# Altium footprint library SAMTEC THD.PcbLib: 161 footprints (part 11 of 12) (continued)
## SAMTEC_TSW-115-23-L-D [mm] "30 Contacts - Pitch 2.54mm - Dual Row  Through Mount Straigh Header (Post Lead 5.84mm, Tail Lead 2.92mm, Insulator 2.54mm)"
height 8.38
pads (30):
  round 1.7 hole 1: 1(-17.78,-1.27) 2(-17.78,1.27) 3(-15.24,-1.27) 4(-15.24,1.27) 5(-12.7,-1.27) 6(-12.7,1.27) 7(-10.16,-1.27) 8(-10.16,1.27) 9(-7.62,-1.27) 10(-7.62,1.27) 11(-5.08,-1.27) 12(-5.08,1.27) 13(-2.54,-1.27) 14(-2.54,1.27) 15(0,-1.27) 16(0,1.27) 17(2.54,-1.27) 18(2.54,1.27) 19(5.08,-1.27) 20(5.08,1.27) 21(7.62,-1.27) 22(7.62,1.27) 23(10.16,-1.27) 24(10.16,1.27) 25(12.7,-1.27) 26(12.7,1.27) 27(15.24,-1.27) 28(15.24,1.27) 29(17.78,-1.27) 30(17.78,1.27)
Top Overlay:
  circle w0.3: c-17.745,-3.135 r0.15
  lines w0.2: -19.05,-2.54 -16.764,-2.54 -16.764,-2.286 -16.256,-2.286 -16.256,-2.54 -14.224,-2.54 -14.224,-2.286 -13.716,-2.286 -13.716,-2.54 -11.684,-2.54 -11.684,-2.286 -11.176,-2.286 -11.176,-2.54 -9.144,-2.54 -9.144,-2.286 -8.636,-2.286 -8.636,-2.54 -6.604,-2.54 -6.604,-2.286 -6.096,-2.286 -6.096,-2.54 -4.064,-2.54 -4.064,-2.286 -3.556,-2.286 -3.556,-2.54 -1.524,-2.54 -1.524,-2.286 -1.016,-2.286 -1.016,-2.54 1.016,-2.54 1.016,-2.286 1.524,-2.286 1.524,-2.54 3.556,-2.54 3.556,-2.286 4.064,-2.286 4.064,-2.54 6.096,-2.54 6.096,-2.286 6.604,-2.286 6.604,-2.54 8.636,-2.54 8.636,-2.286 9.144,-2.286 9.144,-2.54 11.176,-2.54 11.176,-2.286 11.684,-2.286 11.684,-2.54 13.716,-2.54 13.716,-2.286 14.224,-2.286 14.224,-2.54 16.256,-2.54 16.256,-2.286 16.764,-2.286 16.764,-2.54 19.05,-2.54 19.05,2.54 16.764,2.54 16.764,2.286 16.256,2.286 16.256,2.54 14.224,2.54 14.224,2.286 13.716,2.286 13.716,2.54 11.684,2.54 11.684,2.286 11.176,2.286 11.176,2.54 9.144,2.54 9.144,2.286 8.636,2.286 8.636,2.54 6.604,2.54 6.604,2.286 6.096,2.286 6.096,2.54 4.064,2.54 4.064,2.286 3.556,2.286 3.556,2.54 1.524,2.54 1.524,2.286 1.016,2.286 1.016,2.54 -1.016,2.54 -1.016,2.286 -1.524,2.286 -1.524,2.54 -3.556,2.54 -3.556,2.286 -4.064,2.286 -4.064,2.54 -6.096,2.54 -6.096,2.286 -6.604,2.286 -6.604,2.54 -8.636,2.54 -8.636,2.286 -9.144,2.286 -9.144,2.54 -11.176,2.54 -11.176,2.286 -11.684,2.286 -11.684,2.54 -13.716,2.54 -13.716,2.286 -14.224,2.286 -14.224,2.54 -16.256,2.54 -16.256,2.286 -16.764,2.286 -16.764,2.54 -19.05,2.54 -19.05,-2.54
  text "1" at -20.152,-1.768 h1.2
Mechanical 8:
  lines w0.05: -18.28,-1.27 -17.78,-1.27 ; -18.28,1.27 -17.78,1.27 ; -17.78,-1.77 -17.78,-1.27 ; -17.78,-0.77 -17.78,-1.27 ; -17.78,0.77 -17.78,1.27 ; -17.78,1.77 -17.78,1.27 ; -17.28,-1.27 -17.78,-1.27 ; -17.28,1.27 -17.78,1.27 ; -15.74,-1.27 -15.24,-1.27 ; -15.74,1.27 -15.24,1.27 ; -15.24,-1.77 -15.24,-1.27 ; -15.24,-0.77 -15.24,-1.27 ; -15.24,0.77 -15.24,1.27 ; -15.24,1.77 -15.24,1.27 ; -14.74,-1.27 -15.24,-1.27 ; -14.74,1.27 -15.24,1.27 ; -13.2,-1.27 -12.7,-1.27 ; -13.2,1.27 -12.7,1.27 ; -12.7,-1.77 -12.7,-1.27 ; -12.7,-0.77 -12.7,-1.27 ; -12.7,0.77 -12.7,1.27 ; -12.7,1.77 -12.7,1.27 ; -12.2,-1.27 -12.7,-1.27 ; -12.2,1.27 -12.7,1.27 ; -10.66,-1.27 -10.16,-1.27 ; -10.66,1.27 -10.16,1.27 ; -10.16,-1.77 -10.16,-1.27 ; -10.16,-0.77 -10.16,-1.27 ; -10.16,0.77 -10.16,1.27 ; -10.16,1.77 -10.16,1.27 ; -9.66,-1.27 -10.16,-1.27 ; -9.66,1.27 -10.16,1.27 ; -8.12,-1.27 -7.62,-1.27 ; -8.12,1.27 -7.62,1.27 ; -7.62,-1.77 -7.62,-1.27 ; -7.62,-0.77 -7.62,-1.27 ; -7.62,0.77 -7.62,1.27 ; -7.62,1.77 -7.62,1.27 ; -7.12,-1.27 -7.62,-1.27 ; -7.12,1.27 -7.62,1.27 ; -5.58,-1.27 -5.08,-1.27 ; -5.58,1.27 -5.08,1.27 ; -5.08,-1.77 -5.08,-1.27 ; -5.08,-0.77 -5.08,-1.27 ; -5.08,0.77 -5.08,1.27 ; -5.08,1.77 -5.08,1.27 ; -4.58,-1.27 -5.08,-1.27 ; -4.58,1.27 -5.08,1.27 ; -3.04,-1.27 -2.54,-1.27 ; -3.04,1.27 -2.54,1.27 ; -2.54,-1.77 -2.54,-1.27 ; -2.54,-0.77 -2.54,-1.27 ; -2.54,0.77 -2.54,1.27 ; -2.54,1.77 -2.54,1.27 ; -2.04,-1.27 -2.54,-1.27 ; -2.04,1.27 -2.54,1.27 ; -0.5,-1.27 0,-1.27 ; -0.5,0 0,0 ; -0.5,1.27 0,1.27 ; 0,-1.77 0,-1.27 ; 0,-0.77 0,-1.27 ; 0,-0.5 0,0 ; 0,0.5 0,0 ; 0,0.77 0,1.27 ; 0,1.77 0,1.27 ; 0.5,-1.27 0,-1.27 ; 0.5,0 0,0 ; 0.5,1.27 0,1.27 ; 2.04,-1.27 2.54,-1.27 ; 2.04,1.27 2.54,1.27 ; 2.54,-1.77 2.54,-1.27 ; 2.54,-0.77 2.54,-1.27 ; 2.54,0.77 2.54,1.27 ; 2.54,1.77 2.54,1.27 ; 3.04,-1.27 2.54,-1.27 ; 3.04,1.27 2.54,1.27 ; 4.58,-1.27 5.08,-1.27 ; 4.58,1.27 5.08,1.27 ; 5.08,-1.77 5.08,-1.27 ; 5.08,-0.77 5.08,-1.27 ; 5.08,0.77 5.08,1.27 ; 5.08,1.77 5.08,1.27 ; 5.58,-1.27 5.08,-1.27 ; 5.58,1.27 5.08,1.27 ; 7.12,-1.27 7.62,-1.27 ; 7.12,1.27 7.62,1.27 ; 7.62,-1.77 7.62,-1.27 ; 7.62,-0.77 7.62,-1.27 ; 7.62,0.77 7.62,1.27 ; 7.62,1.77 7.62,1.27 ; 8.12,-1.27 7.62,-1.27 ; 8.12,1.27 7.62,1.27 ; 9.66,-1.27 10.16,-1.27 ; 9.66,1.27 10.16,1.27 ; 10.16,-1.77 10.16,-1.27 ; 10.16,-0.77 10.16,-1.27 ; 10.16,0.77 10.16,1.27 ; 10.16,1.77 10.16,1.27 ; 10.66,-1.27 10.16,-1.27 ; 10.66,1.27 10.16,1.27 ; 12.2,-1.27 12.7,-1.27 ; 12.2,1.27 12.7,1.27 ; 12.7,-1.77 12.7,-1.27 ; 12.7,-0.77 12.7,-1.27 ; 12.7,0.77 12.7,1.27 ; 12.7,1.77 12.7,1.27 ; 13.2,-1.27 12.7,-1.27 ; 13.2,1.27 12.7,1.27 ; 14.74,-1.27 15.24,-1.27 ; 14.74,1.27 15.24,1.27 ; 15.24,-1.77 15.24,-1.27 ; 15.24,-0.77 15.24,-1.27 ; 15.24,0.77 15.24,1.27 ; 15.24,1.77 15.24,1.27 ; 15.74,-1.27 15.24,-1.27 ; 15.74,1.27 15.24,1.27 ; 17.28,-1.27 17.78,-1.27 ; 17.28,1.27 17.78,1.27 ; 17.78,-1.77 17.78,-1.27 ; 17.78,-0.77 17.78,-1.27 ; 17.78,0.77 17.78,1.27 ; 17.78,1.77 17.78,1.27 ; 18.28,-1.27 17.78,-1.27 ; 18.28,1.27 17.78,1.27
Mechanical 14:
  lines w0.1: -16.764,-2.286 -16.256,-2.286 ; -16.764,-0.508 -16.256,-0.508 ; -16.764,0.508 -16.256,0.508 ; -16.764,2.286 -16.256,2.286 ; -14.224,-2.286 -13.716,-2.286 ; -14.224,-0.508 -13.716,-0.508 ; -14.224,0.508 -13.716,0.508 ; -14.224,2.286 -13.716,2.286 ; -11.684,-2.286 -11.176,-2.286 ; -11.684,-0.508 -11.176,-0.508 ; -11.684,0.508 -11.176,0.508 ; -11.684,2.286 -11.176,2.286 ; -9.144,-2.286 -8.636,-2.286 ; -9.144,-0.508 -8.636,-0.508 ; -9.144,0.508 -8.636,0.508 ; -9.144,2.286 -8.636,2.286 ; -6.604,-2.286 -6.096,-2.286 ; -6.604,-0.508 -6.096,-0.508 ; -6.604,0.508 -6.096,0.508 ; -6.604,2.286 -6.096,2.286 ; -4.064,-2.286 -3.556,-2.286 ; -4.064,-0.508 -3.556,-0.508 ; -4.064,0.508 -3.556,0.508 ; -4.064,2.286 -3.556,2.286 ; -1.524,-2.286 -1.016,-2.286 ; -1.524,-0.508 -1.016,-0.508 ; -1.524,0.508 -1.016,0.508 ; -1.524,2.286 -1.016,2.286 ; 1.016,-2.286 1.524,-2.286 ; 1.016,-0.508 1.524,-0.508 ; 1.016,0.508 1.524,0.508 ; 1.016,2.286 1.524,2.286 ; 3.556,-2.286 4.064,-2.286 ; 3.556,-0.508 4.064,-0.508 ; 3.556,0.508 4.064,0.508 ; 3.556,2.286 4.064,2.286 ; 6.096,-2.286 6.604,-2.286 ; 6.096,-0.508 6.604,-0.508 ; 6.096,0.508 6.604,0.508 ; 6.096,2.286 6.604,2.286 ; 8.636,-2.286 9.144,-2.286 ; 8.636,-0.508 9.144,-0.508 ; 8.636,0.508 9.144,0.508 ; 8.636,2.286 9.144,2.286 ; 11.176,-2.286 11.684,-2.286 ; 11.176,-0.508 11.684,-0.508 ; 11.176,0.508 11.684,0.508 ; 11.176,2.286 11.684,2.286 ; 13.716,-2.286 14.224,-2.286 ; 13.716,-0.508 14.224,-0.508 ; 13.716,0.508 14.224,0.508 ; 13.716,2.286 14.224,2.286 ; 16.256,-2.286 16.764,-2.286 ; 16.256,-0.508 16.764,-0.508 ; 16.256,0.508 16.764,0.508 ; 16.256,2.286 16.764,2.286 ; -19.05,-2.54 -19.05,2.54 -16.764,2.54 -16.764,-2.54 -19.05,-2.54 ; -16.256,-2.54 -16.256,2.54 -14.224,2.54 -14.224,-2.54 -16.256,-2.54 ; -13.716,-2.54 -11.684,-2.54 -11.684,2.54 -13.716,2.54 -13.716,-2.54 ; -11.176,-2.54 -11.176,2.54 -9.144,2.54 -9.144,-2.54 -11.176,-2.54 ; -8.636,-2.54 -8.636,2.54 -6.604,2.54 -6.604,-2.54 -8.636,-2.54 ; -6.096,-2.54 -6.096,2.54 -4.064,2.54 -4.064,-2.54 -6.096,-2.54 ; -3.556,-2.54 -3.556,2.54 -1.524,2.54 -1.524,-2.54 -3.556,-2.54 ; -1.016,-2.54 -1.016,2.54 1.016,2.54 1.016,-2.54 -1.016,-2.54 ; 1.524,-2.54 1.524,2.54 3.556,2.54 3.556,-2.54 1.524,-2.54 ; 4.064,-2.54 4.064,2.54 6.096,2.54 6.096,-2.54 4.064,-2.54 ; 6.604,-2.54 6.604,2.54 8.636,2.54 8.636,-2.54 6.604,-2.54 ; 9.144,-2.54 9.144,2.54 11.176,2.54 11.176,-2.54 9.144,-2.54 ; 11.684,-2.54 11.684,2.54 13.716,2.54 13.716,-2.54 11.684,-2.54 ; 14.224,-2.54 14.224,2.54 16.256,2.54 16.256,-2.54 14.224,-2.54 ; 16.764,-2.54 16.764,2.54 19.05,2.54 19.05,-2.54 16.764,-2.54
3D body "SAMTEC_TSW-115-23-L-D.stp": height 8.38, standoff -2.92, extent -19.05,-2.54 19.05,2.54

## SAMTEC_TSW-116-08-L-D [mm] "32 Contacts - Pitch 2.54mm - Dual Row  Through Mount Straigh Header (Post Lead 5.84mm, Tail Lead 5.08mm, Insulator 2.54mm)"
height 8.38
pads (32):
  round 1.7 hole 1: 1(-19.05,-1.27) 2(-19.05,1.27) 3(-16.51,-1.27) 4(-16.51,1.27) 5(-13.97,-1.27) 6(-13.97,1.27) 7(-11.43,-1.27) 8(-11.43,1.27) 9(-8.89,-1.27) 10(-8.89,1.27) 11(-6.35,-1.27) 12(-6.35,1.27) 13(-3.81,-1.27) 14(-3.81,1.27) 15(-1.27,-1.27) 16(-1.27,1.27) 17(1.27,-1.27) 18(1.27,1.27) 19(3.81,-1.27) 20(3.81,1.27) 21(6.35,-1.27) 22(6.35,1.27) 23(8.89,-1.27) 24(8.89,1.27) 25(11.43,-1.27) 26(11.43,1.27) 27(13.97,-1.27) 28(13.97,1.27) 29(16.51,-1.27) 30(16.51,1.27) 31(19.05,-1.27) 32(19.05,1.27)
Top Overlay:
  circle w0.3: c-19.015,-3.135 r0.15
  lines w0.2: -20.32,-2.54 -20.32,2.54 -18.034,2.54 -18.034,2.286 -17.526,2.286 -17.526,2.54 -15.494,2.54 -15.494,2.286 -14.986,2.286 -14.986,2.54 -12.954,2.54 -12.954,2.286 -12.446,2.286 -12.446,2.54 -10.414,2.54 -10.414,2.286 -9.906,2.286 -9.906,2.54 -7.874,2.54 -7.874,2.286 -7.366,2.286 -7.366,2.54 -5.334,2.54 -5.334,2.286 -4.826,2.286 -4.826,2.54 -2.794,2.54 -2.794,2.286 -2.286,2.286 -2.286,2.54 -0.254,2.54 -0.254,2.286 0.254,2.286 0.254,2.54 2.286,2.54 2.286,2.286 2.794,2.286 2.794,2.54 4.826,2.54 4.826,2.286 5.334,2.286 5.334,2.54 7.366,2.54 7.366,2.286 7.874,2.286 7.874,2.54 9.906,2.54 9.906,2.286 10.414,2.286 10.414,2.54 12.446,2.54 12.446,2.286 12.954,2.286 12.954,2.54 14.986,2.54 14.986,2.286 15.494,2.286 15.494,2.54 17.526,2.54 17.526,2.286 18.034,2.286 18.034,2.54 20.32,2.54 20.32,-2.54 18.034,-2.54 18.034,-2.286 17.526,-2.286 17.526,-2.54 15.494,-2.54 15.494,-2.286 14.986,-2.286 14.986,-2.54 12.954,-2.54 12.954,-2.286 12.446,-2.286 12.446,-2.54 10.414,-2.54 10.414,-2.286 9.906,-2.286 9.906,-2.54 7.874,-2.54 7.874,-2.286 7.366,-2.286 7.366,-2.54 5.334,-2.54 5.334,-2.286 4.826,-2.286 4.826,-2.54 2.794,-2.54 2.794,-2.286 2.286,-2.286 2.286,-2.54 0.254,-2.54 0.254,-2.286 -0.254,-2.286 -0.254,-2.54 -2.286,-2.54 -2.286,-2.286 -2.794,-2.286 -2.794,-2.54 -4.826,-2.54 -4.826,-2.286 -5.334,-2.286 -5.334,-2.54 -7.366,-2.54 -7.366,-2.286 -7.874,-2.286 -7.874,-2.54 -9.906,-2.54 -9.906,-2.286 -10.414,-2.286 -10.414,-2.54 -12.446,-2.54 -12.446,-2.286 -12.954,-2.286 -12.954,-2.54 -14.986,-2.54 -14.986,-2.286 -15.494,-2.286 -15.494,-2.54 -17.526,-2.54 -17.526,-2.286 -18.034,-2.286 -18.034,-2.54 -20.32,-2.54
  text "1" at -21.422,-1.768 h1.2
Mechanical 8:
  lines w0.1: -19.55,-1.27 -19.05,-1.27 ; -19.55,1.27 -19.05,1.27 ; -19.05,-1.77 -19.05,-1.27 ; -19.05,-0.77 -19.05,-1.27 ; -19.05,0.77 -19.05,1.27 ; -19.05,1.77 -19.05,1.27 ; -18.55,-1.27 -19.05,-1.27 ; -18.55,1.27 -19.05,1.27 ; -17.01,-1.27 -16.51,-1.27 ; -17.01,1.27 -16.51,1.27 ; -16.51,-1.77 -16.51,-1.27 ; -16.51,-0.77 -16.51,-1.27 ; -16.51,0.77 -16.51,1.27 ; -16.51,1.77 -16.51,1.27 ; -16.01,-1.27 -16.51,-1.27 ; -16.01,1.27 -16.51,1.27 ; -14.47,-1.27 -13.97,-1.27 ; -14.47,1.27 -13.97,1.27 ; -13.97,-1.77 -13.97,-1.27 ; -13.97,-0.77 -13.97,-1.27 ; -13.97,0.77 -13.97,1.27 ; -13.97,1.77 -13.97,1.27 ; -13.47,-1.27 -13.97,-1.27 ; -13.47,1.27 -13.97,1.27 ; -11.93,-1.27 -11.43,-1.27 ; -11.93,1.27 -11.43,1.27 ; -11.43,-1.77 -11.43,-1.27 ; -11.43,-0.77 -11.43,-1.27 ; -11.43,0.77 -11.43,1.27 ; -11.43,1.77 -11.43,1.27 ; -10.93,-1.27 -11.43,-1.27 ; -10.93,1.27 -11.43,1.27 ; -9.39,-1.27 -8.89,-1.27 ; -9.39,1.27 -8.89,1.27 ; -8.89,-1.77 -8.89,-1.27 ; -8.89,-0.77 -8.89,-1.27 ; -8.89,0.77 -8.89,1.27 ; -8.89,1.77 -8.89,1.27 ; -8.39,-1.27 -8.89,-1.27 ; -8.39,1.27 -8.89,1.27 ; -6.85,-1.27 -6.35,-1.27 ; -6.85,1.27 -6.35,1.27 ; -6.35,-1.77 -6.35,-1.27 ; -6.35,-0.77 -6.35,-1.27 ; -6.35,0.77 -6.35,1.27 ; -6.35,1.77 -6.35,1.27 ; -5.85,-1.27 -6.35,-1.27 ; -5.85,1.27 -6.35,1.27 ; -4.31,-1.27 -3.81,-1.27 ; -4.31,1.27 -3.81,1.27 ; -3.81,-1.77 -3.81,-1.27 ; -3.81,-0.77 -3.81,-1.27 ; -3.81,0.77 -3.81,1.27 ; -3.81,1.77 -3.81,1.27 ; -3.31,-1.27 -3.81,-1.27 ; -3.31,1.27 -3.81,1.27 ; -1.77,-1.27 -1.27,-1.27 ; -1.77,1.27 -1.27,1.27 ; -1.27,-1.77 -1.27,-1.27 ; -1.27,-0.77 -1.27,-1.27 ; -1.27,0.77 -1.27,1.27 ; -1.27,1.77 -1.27,1.27 ; -0.77,-1.27 -1.27,-1.27 ; -0.77,1.27 -1.27,1.27 ; -0.5,0 0,0 ; 0,-0.5 0,0 ; 0,0.5 0,0 ; 0.5,0 0,0 ; 0.77,-1.27 1.27,-1.27 ; 0.77,1.27 1.27,1.27 ; 1.27,-1.77 1.27,-1.27 ; 1.27,-0.77 1.27,-1.27 ; 1.27,0.77 1.27,1.27 ; 1.27,1.77 1.27,1.27 ; 1.77,-1.27 1.27,-1.27 ; 1.77,1.27 1.27,1.27 ; 3.31,-1.27 3.81,-1.27 ; 3.31,1.27 3.81,1.27 ; 3.81,-1.77 3.81,-1.27 ; 3.81,-0.77 3.81,-1.27 ; 3.81,0.77 3.81,1.27 ; 3.81,1.77 3.81,1.27 ; 4.31,-1.27 3.81,-1.27 ; 4.31,1.27 3.81,1.27 ; 5.85,-1.27 6.35,-1.27 ; 5.85,1.27 6.35,1.27 ; 6.35,-1.77 6.35,-1.27 ; 6.35,-0.77 6.35,-1.27 ; 6.35,0.77 6.35,1.27 ; 6.35,1.77 6.35,1.27 ; 6.85,-1.27 6.35,-1.27 ; 6.85,1.27 6.35,1.27 ; 8.39,-1.27 8.89,-1.27 ; 8.39,1.27 8.89,1.27 ; 8.89,-1.77 8.89,-1.27 ; 8.89,-0.77 8.89,-1.27 ; 8.89,0.77 8.89,1.27 ; 8.89,1.77 8.89,1.27 ; 9.39,-1.27 8.89,-1.27 ; 9.39,1.27 8.89,1.27 ; 10.93,-1.27 11.43,-1.27 ; 10.93,1.27 11.43,1.27 ; 11.43,-1.77 11.43,-1.27 ; 11.43,-0.77 11.43,-1.27 ; 11.43,0.77 11.43,1.27 ; 11.43,1.77 11.43,1.27 ; 11.93,-1.27 11.43,-1.27 ; 11.93,1.27 11.43,1.27 ; 13.47,-1.27 13.97,-1.27 ; 13.47,1.27 13.97,1.27 ; 13.97,-1.77 13.97,-1.27 ; 13.97,-0.77 13.97,-1.27 ; 13.97,0.77 13.97,1.27 ; 13.97,1.77 13.97,1.27 ; 14.47,-1.27 13.97,-1.27 ; 14.47,1.27 13.97,1.27 ; 16.01,-1.27 16.51,-1.27 ; 16.01,1.27 16.51,1.27 ; 16.51,-1.77 16.51,-1.27 ; 16.51,-0.77 16.51,-1.27 ; 16.51,0.77 16.51,1.27 ; 16.51,1.77 16.51,1.27 ; 17.01,-1.27 16.51,-1.27 ; 17.01,1.27 16.51,1.27 ; 18.55,-1.27 19.05,-1.27 ; 18.55,1.27 19.05,1.27 ; 19.05,-1.77 19.05,-1.27 ; 19.05,-0.77 19.05,-1.27 ; 19.05,0.77 19.05,1.27 ; 19.05,1.77 19.05,1.27 ; 19.55,-1.27 19.05,-1.27 ; 19.55,1.27 19.05,1.27
Mechanical 14:
  drawing of 251 lines, arcs and shapes, not listed
3D body "SAMTEC_TSW-116-08-L-D.stp": height 8.38, standoff -5.08, extent -20.32,-2.54 20.32,2.54

## SAMTEC_TSW-116-08-L-S [mm] "16 Contacts - Pitch 2.54mm - Single Row  Through Mount Straigh Header (Post Lead 5.84mm, Tail Lead 5.08mm, Insulator 2.54mm)"
height 8.38
pads (16):
  rect 1.7x1.7 hole 1: 1(0,0)
  round 1.7 hole 1: 2(2.54,0) 3(5.08,0) 4(7.62,0) 5(10.16,0) 6(12.7,0) 7(15.24,0) 8(17.78,0) 9(20.32,0) 10(22.86,0) 11(25.4,0) 12(27.94,0) 13(30.48,0) 14(33.02,0) 15(35.56,0) 16(38.1,0)
Top Overlay:
  circle w0.3: c-0.508,1.778 r0.15
  lines w0.2: 1.007,-1.2 1.007,-1.27 -1.27,-1.27 -1.27,1.27 1.007,1.27 1.007,1.2 ; 1.2,-0.762 1.533,-0.762 ; 1.2,0.762 1.533,0.762 ; 1.524,-0.762 1.524,-1.27 3.556,-1.27 3.556,-0.762 4.064,-0.762 4.064,-1.27 6.096,-1.27 6.096,-0.762 6.604,-0.762 6.604,-1.27 8.636,-1.27 8.636,-0.762 9.144,-0.762 9.144,-1.27 11.176,-1.27 11.176,-0.762 11.684,-0.762 11.684,-1.27 13.716,-1.27 13.716,-0.762 14.224,-0.762 14.224,-1.27 16.256,-1.27 16.256,-0.762 16.764,-0.762 16.764,-1.27 18.796,-1.27 18.796,-0.762 19.304,-0.762 19.304,-1.27 21.336,-1.27 21.336,-0.762 21.844,-0.762 21.844,-1.27 23.876,-1.27 23.876,-0.762 24.384,-0.762 24.384,-1.27 26.416,-1.27 26.416,-0.762 26.924,-0.762 26.924,-1.27 28.956,-1.27 28.956,-0.762 29.464,-0.762 29.464,-1.27 31.496,-1.27 31.496,-0.762 32.004,-0.762 32.004,-1.27 34.036,-1.27 34.036,-0.762 34.544,-0.762 34.544,-1.27 36.576,-1.27 36.576,-0.762 37.084,-0.762 37.084,-1.27 39.37,-1.27 39.37,1.27 37.084,1.27 37.084,0.762 36.576,0.762 36.576,1.27 34.544,1.27 34.544,0.762 34.036,0.762 34.036,1.27 32.004,1.27 32.004,0.762 31.496,0.762 31.496,1.27 29.464,1.27 29.464,0.762 28.956,0.762 28.956,1.27 26.924,1.27 26.924,0.762 26.416,0.762 26.416,1.27 24.384,1.27 24.384,0.762 23.876,0.762 23.876,1.27 21.844,1.27 21.844,0.762 21.336,0.762 21.336,1.27 19.304,1.27 19.304,0.762 18.796,0.762 18.796,1.27 16.764,1.27 16.764,0.762 16.256,0.762 16.256,1.27 14.224,1.27 14.224,0.762 13.716,0.762 13.716,1.27 11.684,1.27 11.684,0.762 11.176,0.762 11.176,1.27 9.144,1.27 9.144,0.762 8.636,0.762 8.636,1.27 6.604,1.27 6.604,0.762 6.096,0.762 6.096,1.27 4.064,1.27 4.064,0.762 3.556,0.762 3.556,1.27 1.524,1.27 1.524,0.762
Mechanical 8:
  lines w0.1: -0.5,0 0,0 ; 0,-0.5 0,0 ; 0,0.5 0,0 ; 0.5,0 0,0 ; 2.04,0 2.54,0 ; 2.54,-0.5 2.54,0 ; 2.54,0.5 2.54,0 ; 3.04,0 2.54,0 ; 4.58,0 5.08,0 ; 5.08,-0.5 5.08,0 ; 5.08,0.5 5.08,0 ; 5.58,0 5.08,0 ; 7.12,0 7.62,0 ; 7.62,-0.5 7.62,0 ; 7.62,0.5 7.62,0 ; 8.12,0 7.62,0 ; 9.66,0 10.16,0 ; 10.16,-0.5 10.16,0 ; 10.16,0.5 10.16,0 ; 10.66,0 10.16,0 ; 12.2,0 12.7,0 ; 12.7,-0.5 12.7,0 ; 12.7,0.5 12.7,0 ; 13.2,0 12.7,0 ; 14.74,0 15.24,0 ; 15.24,-0.5 15.24,0 ; 15.24,0.5 15.24,0 ; 15.74,0 15.24,0 ; 17.28,0 17.78,0 ; 17.78,-0.5 17.78,0 ; 17.78,0.5 17.78,0 ; 18.28,0 17.78,0 ; 19.82,0 20.32,0 ; 20.32,-0.5 20.32,0 ; 20.32,0.5 20.32,0 ; 20.82,0 20.32,0 ; 22.36,0 22.86,0 ; 22.86,-0.5 22.86,0 ; 22.86,0.5 22.86,0 ; 23.36,0 22.86,0 ; 24.9,0 25.4,0 ; 25.4,-0.5 25.4,0 ; 25.4,0.5 25.4,0 ; 25.9,0 25.4,0 ; 27.44,0 27.94,0 ; 27.94,-0.5 27.94,0 ; 27.94,0.5 27.94,0 ; 28.44,0 27.94,0 ; 29.98,0 30.48,0 ; 30.48,-0.5 30.48,0 ; 30.48,0.5 30.48,0 ; 30.98,0 30.48,0 ; 32.52,0 33.02,0 ; 33.02,-0.5 33.02,0 ; 33.02,0.5 33.02,0 ; 33.52,0 33.02,0 ; 35.06,0 35.56,0 ; 35.56,-0.5 35.56,0 ; 35.56,0.5 35.56,0 ; 36.06,0 35.56,0 ; 37.6,0 38.1,0 ; 38.1,-0.5 38.1,0 ; 38.1,0.5 38.1,0 ; 38.6,0 38.1,0
Mechanical 14:
  drawing of 159 lines, arcs and shapes, not listed
3D body "SAMTEC_TSW-116-08-L-S.stp": height 8.38, standoff -5.08, extent -1.397,-1.27 39.37,1.27

## SAMTEC_TSW-116-08-L-T-RA [mm] "48 Contacts - Pitch 2.54mm - Triple Row Through Mount  Right Angle Header (Post Lead 5.84mm, Tail Lead 2.29mm, Insulator 2.54mm)"
height 8.13
pads (48):
  round 1.7 hole 1: 1(-19.05,-2.54) 2(-19.05,0) 3(-19.05,2.54) 4(-16.51,-2.54) 5(-16.51,0) 6(-16.51,2.54) 7(-13.97,-2.54) 8(-13.97,0) 9(-13.97,2.54) 10(-11.43,-2.54) 11(-11.43,0) 12(-11.43,2.54) 13(-8.89,-2.54) 14(-8.89,0) 15(-8.89,2.54) 16(-6.35,-2.54) 17(-6.35,0) 18(-6.35,2.54) 19(-3.81,-2.54) 20(-3.81,0) 21(-3.81,2.54) 22(-1.27,-2.54) 23(-1.27,0) 24(-1.27,2.54) 25(1.27,-2.54) 26(1.27,0) 27(1.27,2.54) 28(3.81,-2.54) 29(3.81,0) 30(3.81,2.54) 31(6.35,-2.54) 32(6.35,0) 33(6.35,2.54) 34(8.89,-2.54) 35(8.89,0) 36(8.89,2.54) 37(11.43,-2.54) 38(11.43,0) 39(11.43,2.54) 40(13.97,-2.54) 41(13.97,0) 42(13.97,2.54) 43(16.51,-2.54) 44(16.51,0) 45(16.51,2.54) 46(19.05,-2.54) 47(19.05,0) 48(19.05,2.54)
Top Overlay:
  drawing of 291 lines, arcs and shapes, not listed
  text "3" at -21.722,2.042 h1.2
  text "2" at -21.722,-0.498 h1.2
  text "1" at -21.422,-3.038 h1.2
  text "48" at 20.645,1.96 h1.2
Mechanical 8:
  drawing of 196 lines, arcs and shapes, not listed
Mechanical 14:
  drawing of 307 lines, arcs and shapes, not listed
  text "3" at -21.722,2.042 h1.2
  text "2" at -21.722,-0.498 h1.2
  text "1" at -21.422,-3.038 h1.2
  text "48" at 20.645,1.96 h1.2
3D body "SAMTEC_TSW-116-08-L-T-RA.stp": height 8.13, standoff -2.29, extent -20.32,-2.857 20.32,12.446

## SAMTEC_TSW-116-23-L-D [mm] "32 Contacts - Pitch 2.54mm - Dual Row  Through Mount Straigh Header (Post Lead 5.84mm, Tail Lead 2.92mm, Insulator 2.54mm)"
height 8.38
pads (32):
  round 1.7 hole 1: 1(-19.05,-1.27) 2(-19.05,1.27) 3(-16.51,-1.27) 4(-16.51,1.27) 5(-13.97,-1.27) 6(-13.97,1.27) 7(-11.43,-1.27) 8(-11.43,1.27) 9(-8.89,-1.27) 10(-8.89,1.27) 11(-6.35,-1.27) 12(-6.35,1.27) 13(-3.81,-1.27) 14(-3.81,1.27) 15(-1.27,-1.27) 16(-1.27,1.27) 17(1.27,-1.27) 18(1.27,1.27) 19(3.81,-1.27) 20(3.81,1.27) 21(6.35,-1.27) 22(6.35,1.27) 23(8.89,-1.27) 24(8.89,1.27) 25(11.43,-1.27) 26(11.43,1.27) 27(13.97,-1.27) 28(13.97,1.27) 29(16.51,-1.27) 30(16.51,1.27) 31(19.05,-1.27) 32(19.05,1.27)
Top Overlay:
  circle w0.3: c-19.015,-3.135 r0.15
  lines w0.2: -20.32,-2.54 -18.034,-2.54 -18.034,-2.286 -17.526,-2.286 -17.526,-2.54 -15.494,-2.54 -15.494,-2.286 -14.986,-2.286 -14.986,-2.54 -12.954,-2.54 -12.954,-2.286 -12.446,-2.286 -12.446,-2.54 -10.414,-2.54 -10.414,-2.286 -9.906,-2.286 -9.906,-2.54 -7.874,-2.54 -7.874,-2.286 -7.366,-2.286 -7.366,-2.54 -5.334,-2.54 -5.334,-2.286 -4.826,-2.286 -4.826,-2.54 -2.794,-2.54 -2.794,-2.286 -2.286,-2.286 -2.286,-2.54 -0.254,-2.54 -0.254,-2.286 0.254,-2.286 0.254,-2.54 2.286,-2.54 2.286,-2.286 2.794,-2.286 2.794,-2.54 4.826,-2.54 4.826,-2.286 5.334,-2.286 5.334,-2.54 7.366,-2.54 7.366,-2.286 7.874,-2.286 7.874,-2.54 9.906,-2.54 9.906,-2.286 10.414,-2.286 10.414,-2.54 12.446,-2.54 12.446,-2.286 12.954,-2.286 12.954,-2.54 14.986,-2.54 14.986,-2.286 15.494,-2.286 15.494,-2.54 17.526,-2.54 17.526,-2.286 18.034,-2.286 18.034,-2.54 20.32,-2.54 20.32,2.54 18.034,2.54 18.034,2.286 17.526,2.286 17.526,2.54 15.494,2.54 15.494,2.286 14.986,2.286 14.986,2.54 12.954,2.54 12.954,2.286 12.446,2.286 12.446,2.54 10.414,2.54 10.414,2.286 9.906,2.286 9.906,2.54 7.874,2.54 7.874,2.286 7.366,2.286 7.366,2.54 5.334,2.54 5.334,2.286 4.826,2.286 4.826,2.54 2.794,2.54 2.794,2.286 2.286,2.286 2.286,2.54 0.254,2.54 0.254,2.286 -0.254,2.286 -0.254,2.54 -2.286,2.54 -2.286,2.286 -2.794,2.286 -2.794,2.54 -4.826,2.54 -4.826,2.286 -5.334,2.286 -5.334,2.54 -7.366,2.54 -7.366,2.286 -7.874,2.286 -7.874,2.54 -9.906,2.54 -9.906,2.286 -10.414,2.286 -10.414,2.54 -12.446,2.54 -12.446,2.286 -12.954,2.286 -12.954,2.54 -14.986,2.54 -14.986,2.286 -15.494,2.286 -15.494,2.54 -17.526,2.54 -17.526,2.286 -18.034,2.286 -18.034,2.54 -20.32,2.54 -20.32,-2.54
  text "1" at -21.422,-1.768 h1.2
Mechanical 8:
  lines w0.05: -19.55,-1.27 -19.05,-1.27 ; -19.55,1.27 -19.05,1.27 ; -19.05,-1.77 -19.05,-1.27 ; -19.05,-0.77 -19.05,-1.27 ; -19.05,0.77 -19.05,1.27 ; -19.05,1.77 -19.05,1.27 ; -18.55,-1.27 -19.05,-1.27 ; -18.55,1.27 -19.05,1.27 ; -17.01,-1.27 -16.51,-1.27 ; -17.01,1.27 -16.51,1.27 ; -16.51,-1.77 -16.51,-1.27 ; -16.51,-0.77 -16.51,-1.27 ; -16.51,0.77 -16.51,1.27 ; -16.51,1.77 -16.51,1.27 ; -16.01,-1.27 -16.51,-1.27 ; -16.01,1.27 -16.51,1.27 ; -14.47,-1.27 -13.97,-1.27 ; -14.47,1.27 -13.97,1.27 ; -13.97,-1.77 -13.97,-1.27 ; -13.97,-0.77 -13.97,-1.27 ; -13.97,0.77 -13.97,1.27 ; -13.97,1.77 -13.97,1.27 ; -13.47,-1.27 -13.97,-1.27 ; -13.47,1.27 -13.97,1.27 ; -11.93,-1.27 -11.43,-1.27 ; -11.93,1.27 -11.43,1.27 ; -11.43,-1.77 -11.43,-1.27 ; -11.43,-0.77 -11.43,-1.27 ; -11.43,0.77 -11.43,1.27 ; -11.43,1.77 -11.43,1.27 ; -10.93,-1.27 -11.43,-1.27 ; -10.93,1.27 -11.43,1.27 ; -9.39,-1.27 -8.89,-1.27 ; -9.39,1.27 -8.89,1.27 ; -8.89,-1.77 -8.89,-1.27 ; -8.89,-0.77 -8.89,-1.27 ; -8.89,0.77 -8.89,1.27 ; -8.89,1.77 -8.89,1.27 ; -8.39,-1.27 -8.89,-1.27 ; -8.39,1.27 -8.89,1.27 ; -6.85,-1.27 -6.35,-1.27 ; -6.85,1.27 -6.35,1.27 ; -6.35,-1.77 -6.35,-1.27 ; -6.35,-0.77 -6.35,-1.27 ; -6.35,0.77 -6.35,1.27 ; -6.35,1.77 -6.35,1.27 ; -5.85,-1.27 -6.35,-1.27 ; -5.85,1.27 -6.35,1.27 ; -4.31,-1.27 -3.81,-1.27 ; -4.31,1.27 -3.81,1.27 ; -3.81,-1.77 -3.81,-1.27 ; -3.81,-0.77 -3.81,-1.27 ; -3.81,0.77 -3.81,1.27 ; -3.81,1.77 -3.81,1.27 ; -3.31,-1.27 -3.81,-1.27 ; -3.31,1.27 -3.81,1.27 ; -1.77,-1.27 -1.27,-1.27 ; -1.77,1.27 -1.27,1.27 ; -1.27,-1.77 -1.27,-1.27 ; -1.27,-0.77 -1.27,-1.27 ; -1.27,0.77 -1.27,1.27 ; -1.27,1.77 -1.27,1.27 ; -0.77,-1.27 -1.27,-1.27 ; -0.77,1.27 -1.27,1.27 ; -0.5,0 0,0 ; 0,-0.5 0,0 ; 0,0.5 0,0 ; 0.5,0 0,0 ; 0.77,-1.27 1.27,-1.27 ; 0.77,1.27 1.27,1.27 ; 1.27,-1.77 1.27,-1.27 ; 1.27,-0.77 1.27,-1.27 ; 1.27,0.77 1.27,1.27 ; 1.27,1.77 1.27,1.27 ; 1.77,-1.27 1.27,-1.27 ; 1.77,1.27 1.27,1.27 ; 3.31,-1.27 3.81,-1.27 ; 3.31,1.27 3.81,1.27 ; 3.81,-1.77 3.81,-1.27 ; 3.81,-0.77 3.81,-1.27 ; 3.81,0.77 3.81,1.27 ; 3.81,1.77 3.81,1.27 ; 4.31,-1.27 3.81,-1.27 ; 4.31,1.27 3.81,1.27 ; 5.85,-1.27 6.35,-1.27 ; 5.85,1.27 6.35,1.27 ; 6.35,-1.77 6.35,-1.27 ; 6.35,-0.77 6.35,-1.27 ; 6.35,0.77 6.35,1.27 ; 6.35,1.77 6.35,1.27 ; 6.85,-1.27 6.35,-1.27 ; 6.85,1.27 6.35,1.27 ; 8.39,-1.27 8.89,-1.27 ; 8.39,1.27 8.89,1.27 ; 8.89,-1.77 8.89,-1.27 ; 8.89,-0.77 8.89,-1.27 ; 8.89,0.77 8.89,1.27 ; 8.89,1.77 8.89,1.27 ; 9.39,-1.27 8.89,-1.27 ; 9.39,1.27 8.89,1.27 ; 10.93,-1.27 11.43,-1.27 ; 10.93,1.27 11.43,1.27 ; 11.43,-1.77 11.43,-1.27 ; 11.43,-0.77 11.43,-1.27 ; 11.43,0.77 11.43,1.27 ; 11.43,1.77 11.43,1.27 ; 11.93,-1.27 11.43,-1.27 ; 11.93,1.27 11.43,1.27 ; 13.47,-1.27 13.97,-1.27 ; 13.47,1.27 13.97,1.27 ; 13.97,-1.77 13.97,-1.27 ; 13.97,-0.77 13.97,-1.27 ; 13.97,0.77 13.97,1.27 ; 13.97,1.77 13.97,1.27 ; 14.47,-1.27 13.97,-1.27 ; 14.47,1.27 13.97,1.27 ; 16.01,-1.27 16.51,-1.27 ; 16.01,1.27 16.51,1.27 ; 16.51,-1.77 16.51,-1.27 ; 16.51,-0.77 16.51,-1.27 ; 16.51,0.77 16.51,1.27 ; 16.51,1.77 16.51,1.27 ; 17.01,-1.27 16.51,-1.27 ; 17.01,1.27 16.51,1.27 ; 18.55,-1.27 19.05,-1.27 ; 18.55,1.27 19.05,1.27 ; 19.05,-1.77 19.05,-1.27 ; 19.05,-0.77 19.05,-1.27 ; 19.05,0.77 19.05,1.27 ; 19.05,1.77 19.05,1.27 ; 19.55,-1.27 19.05,-1.27 ; 19.55,1.27 19.05,1.27
Mechanical 14:
  lines w0.1: -18.034,-2.286 -17.526,-2.286 ; -18.034,-0.508 -17.526,-0.508 ; -18.034,0.508 -17.526,0.508 ; -18.034,2.286 -17.526,2.286 ; -15.494,-2.286 -14.986,-2.286 ; -15.494,-0.508 -14.986,-0.508 ; -15.494,0.508 -14.986,0.508 ; -15.494,2.286 -14.986,2.286 ; -14.986,-2.54 -14.986,2.54 -12.954,2.54 -12.954,-2.54 ; -12.954,-2.286 -12.446,-2.286 ; -12.954,-0.508 -12.446,-0.508 ; -12.954,0.508 -12.446,0.508 ; -12.954,2.286 -12.446,2.286 ; -10.414,-2.286 -9.906,-2.286 ; -10.414,-0.508 -9.906,-0.508 ; -10.414,0.508 -9.906,0.508 ; -10.414,2.286 -9.906,2.286 ; -7.874,-2.286 -7.366,-2.286 ; -7.874,-0.508 -7.366,-0.508 ; -7.874,0.508 -7.366,0.508 ; -7.874,2.286 -7.366,2.286 ; -5.334,-2.286 -4.826,-2.286 ; -5.334,-0.508 -4.826,-0.508 ; -5.334,0.508 -4.826,0.508 ; -5.334,2.286 -4.826,2.286 ; -2.794,-2.286 -2.286,-2.286 ; -2.794,-0.508 -2.286,-0.508 ; -2.794,0.508 -2.286,0.508 ; -2.794,2.286 -2.286,2.286 ; -0.254,-2.286 0.254,-2.286 ; -0.254,-0.508 0.254,-0.508 ; -0.254,0.508 0.254,0.508 ; -0.254,2.286 0.254,2.286 ; 2.286,-2.286 2.794,-2.286 ; 2.286,-0.508 2.794,-0.508 ; 2.286,0.508 2.794,0.508 ; 2.286,2.286 2.794,2.286 ; 4.826,-2.286 5.334,-2.286 ; 4.826,-0.508 5.334,-0.508 ; 4.826,0.508 5.334,0.508 ; 4.826,2.286 5.334,2.286 ; 7.366,-2.286 7.874,-2.286 ; 7.366,-0.508 7.874,-0.508 ; 7.366,0.508 7.874,0.508 ; 7.366,2.286 7.874,2.286 ; 9.906,-2.286 10.414,-2.286 ; 9.906,-0.508 10.414,-0.508 ; 9.906,0.508 10.414,0.508 ; 9.906,2.286 10.414,2.286 ; 12.446,-2.286 12.954,-2.286 ; 12.446,-0.508 12.954,-0.508 ; 12.446,0.508 12.954,0.508 ; 12.446,2.286 12.954,2.286 ; 14.986,-2.286 15.494,-2.286 ; 14.986,-0.508 15.494,-0.508 ; 14.986,0.508 15.494,0.508 ; 14.986,2.286 15.494,2.286 ; 17.526,-2.286 18.034,-2.286 ; 17.526,-0.508 18.034,-0.508 ; 17.526,0.508 18.034,0.508 ; 17.526,2.286 18.034,2.286 ; -20.32,-2.54 -20.32,2.54 -18.034,2.54 -18.034,-2.54 -20.32,-2.54 ; -17.526,-2.54 -17.526,2.54 -15.494,2.54 -15.494,-2.54 -17.526,-2.54 ; -12.446,-2.54 -12.446,2.54 -10.414,2.54 -10.414,-2.54 -12.446,-2.54 ; -9.906,-2.54 -9.906,2.54 -7.874,2.54 -7.874,-2.54 -9.906,-2.54 ; -7.366,-2.54 -7.366,2.54 -5.334,2.54 -5.334,-2.54 -7.366,-2.54 ; -4.826,-2.54 -4.826,2.54 -2.794,2.54 -2.794,-2.54 -4.826,-2.54 ; -2.286,-2.54 -2.286,2.54 -0.254,2.54 -0.254,-2.54 -2.286,-2.54 ; 0.254,-2.54 0.254,2.54 2.286,2.54 2.286,-2.54 0.254,-2.54 ; 2.794,-2.54 2.794,2.54 4.826,2.54 4.826,-2.54 2.794,-2.54 ; 5.334,-2.54 5.334,2.54 7.366,2.54 7.366,-2.54 5.334,-2.54 ; 7.874,-2.54 7.874,2.54 9.906,2.54 9.906,-2.54 7.874,-2.54 ; 10.414,-2.54 10.414,2.54 12.446,2.54 12.446,-2.54 10.414,-2.54 ; 12.954,-2.54 12.954,2.54 14.986,2.54 14.986,-2.54 12.954,-2.54 ; 15.494,-2.54 15.494,2.54 17.526,2.54 17.526,-2.54 15.494,-2.54 ; 18.034,-2.54 18.034,2.54 20.32,2.54 20.32,-2.54 18.034,-2.54
3D body "SAMTEC_TSW-116-23-L-D.stp": height 8.38, standoff -2.92, extent -20.32,-2.54 20.32,2.54